# Altium footprint library PartsDatabaseV16.1.PcbLib: 145 footprints (part 10 of 10)
Each footprint in its own frame and in the unit in brackets; x right, y up, seen from the top. Pads: shape width x height; smd on the part's side, far side on the other; paste and mask are expansions set on the pad; w line width, h text height; cw(c..) or ccw(c..) is an arc to the next point about the centre after c.
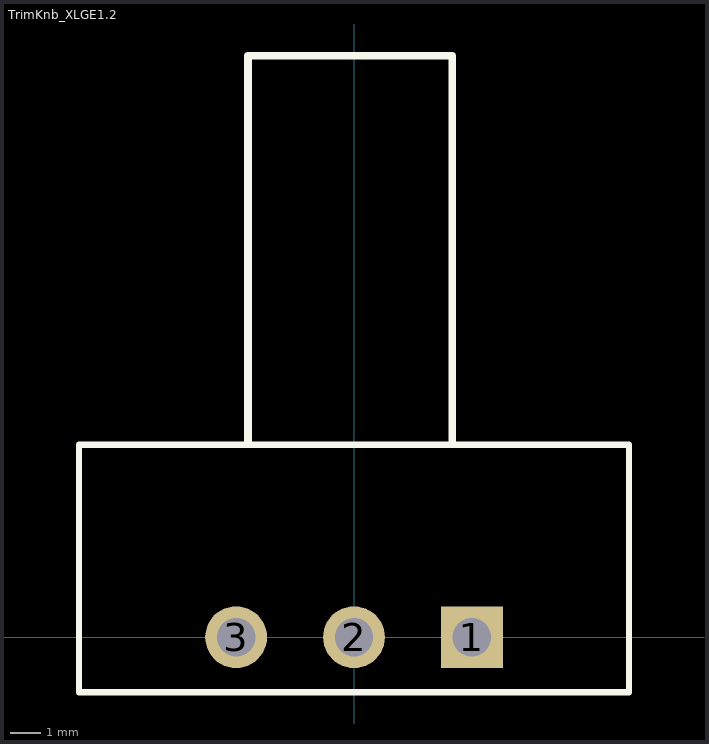
[diagram p9: the footprint, top view; thin cyan lines are the x and y axes]

## TrimKnb_XLGE1.2 [mm] "Variable Resistor, Thru-Hole, 3 Leads, knob"
pads (3):
  rect 2x2 hole 1.245: 1(3.81,0)
  round 2 hole 1.245: 2(0,0) 3(-3.81,0)
Top Overlay:
  lines w0.2: -8.89,-1.778 -8.89,6.223 8.89,6.223 8.89,-1.778 -8.89,-1.778
  lines w0.254: -3.429,6.274 -3.429,18.796 3.175,18.796 3.175,6.274